# Altium footprint library PcbLib1.PcbLib: 56 footprints (part 1 of 4)
Each footprint in its own frame and in the unit in brackets; x right, y up, seen from the top. Pads: shape width x height; smd on the part's side, far side on the other; paste and mask are expansions set on the pad; w line width, h text height; cw(c..) or ccw(c..) is an arc to the next point about the centre after c.
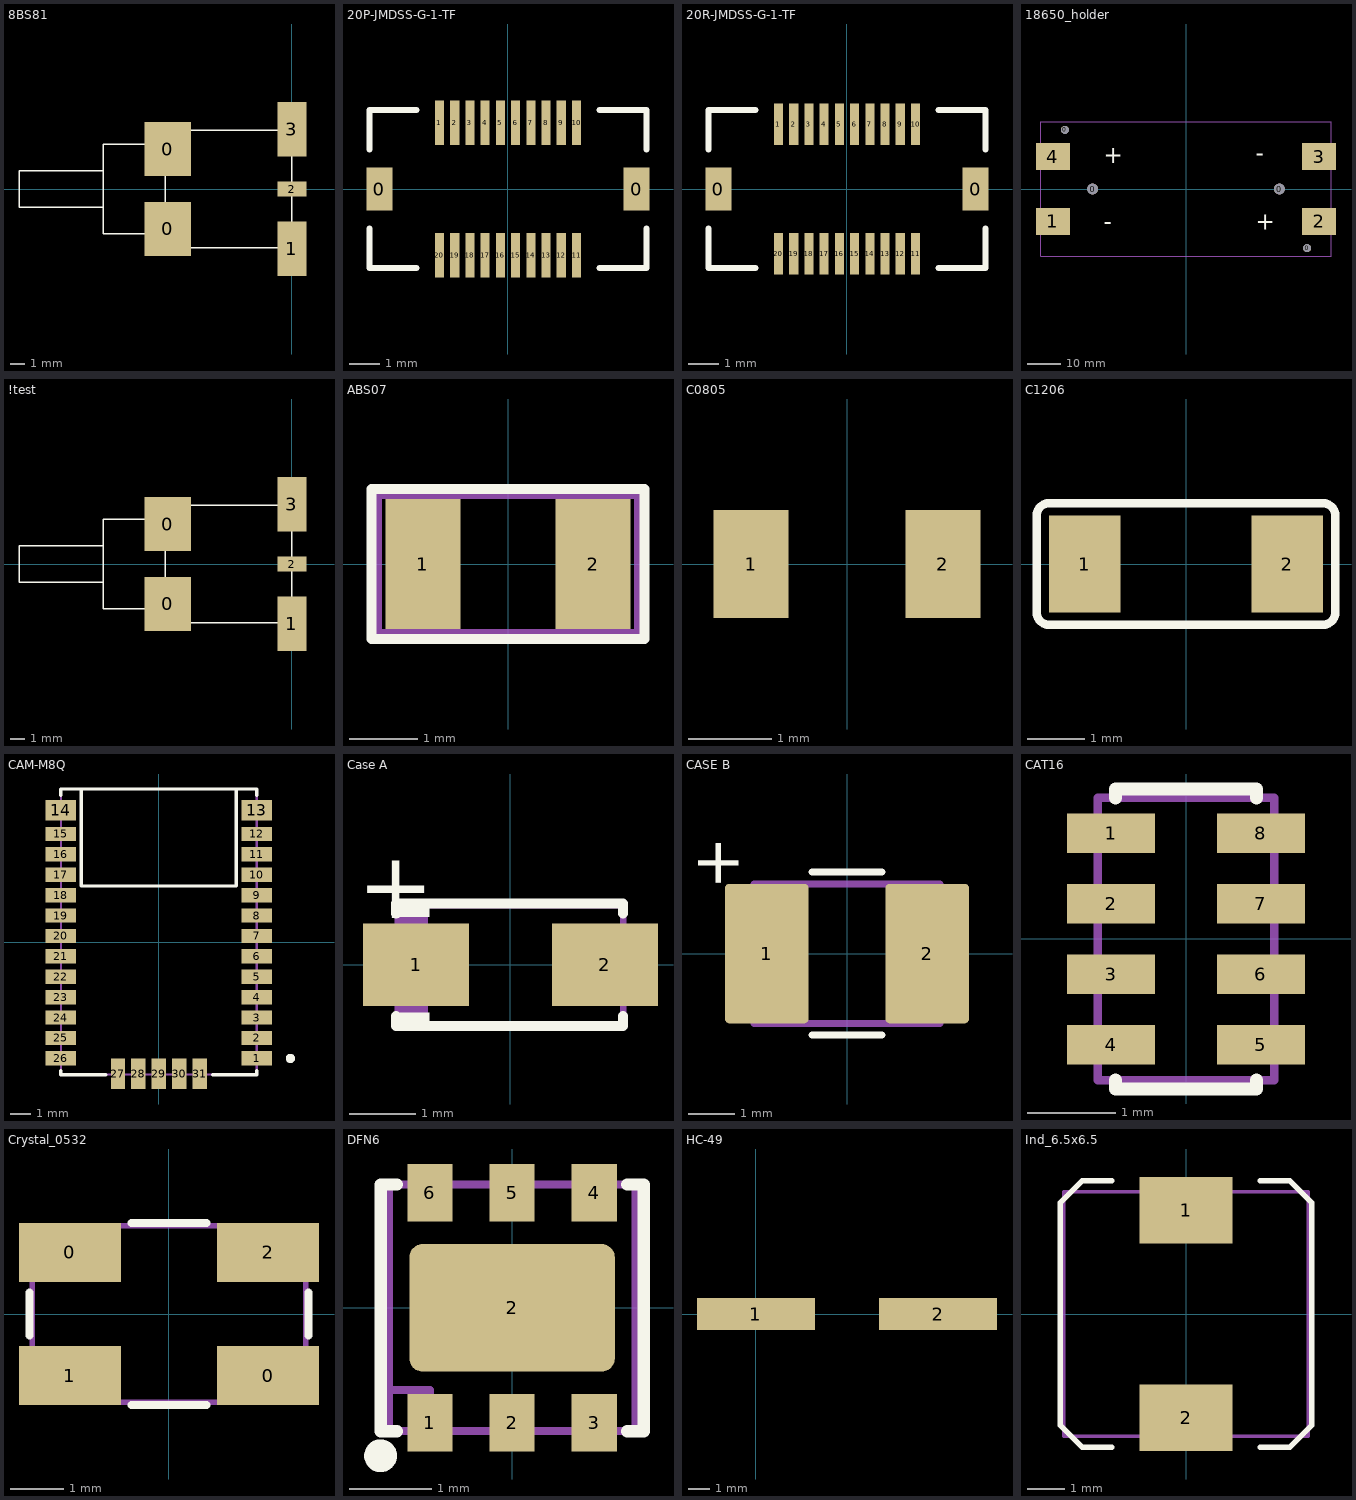
[diagram p0: the footprints below, top view; thin cyan lines are the x and y axes]

## 8BS81 [mm] "Button"
pads (5):
  rect 3.25x3.81 smd: 0(-8.7,-2.8) 0(-8.7,2.8)
  rect 2.03x3.81 smd: 1(0,-4.195) 3(0,4.195)
  rect 2.03x1.02 smd: 2(0,0)
Top Overlay:
  lines w0.1: -13.25,-1.27 -19.15,-1.27 -19.15,1.27 -13.25,1.27 ; -8.9,-3.15 -13.25,-3.15 -13.25,3.15 -8.9,3.15 ; -8.9,-4.115 0,-4.115 0,4.115 -8.9,4.115 -8.9,-4.115
3D body: height 6.2, standoff 0, extent -8.9,-4.125 0,4.125
3D body: height 6.2, standoff 0, extent -13.25,-3.15 -8.9,3.15
3D body: height 4.42, standoff 1.88, extent -19.15,-1.275 -13.25,1.275

## 20P-JMDSS-G-1-TF [mm] "20 pin plug"
pads (22):
  rect 0.85x1.4 smd: 0(-4.225,0) 0(4.225,0)
  rect 0.3x1.45 smd: 1(-2.25,2.175) 2(-1.75,2.175) 3(-1.25,2.175) 4(-0.75,2.175) 5(-0.25,2.175) 6(0.25,2.175) 7(0.75,2.175) 8(1.25,2.175) 9(1.75,2.175) 10(2.25,2.175) 11(2.25,-2.175) 12(1.75,-2.175) 13(1.25,-2.175) 14(0.75,-2.175) 15(0.25,-2.175) 16(-0.25,-2.175) 17(-0.75,-2.175) 18(-1.25,-2.175) 19(-1.75,-2.175) 20(-2.25,-2.175)
Top Overlay:
  lines w0.2: -4.55,-1.3 -4.55,-2.6 -3,-2.6 ; -4.55,1.3 -4.55,2.6 -3,2.6 ; 3,-2.6 4.55,-2.6 4.55,-1.3 ; 3,2.6 4.55,2.6 4.55,1.3

## 20R-JMDSS-G-1-TF [mm] "20 pin Receptacle"
pads (22):
  rect 0.85x1.4 smd: 0(-4.225,0) 0(4.225,0)
  rect 0.3x1.35 smd: 1(-2.25,2.125) 2(-1.75,2.125) 3(-1.25,2.125) 4(-0.75,2.125) 5(-0.25,2.125) 6(0.25,2.125) 7(0.75,2.125) 8(1.25,2.125) 9(1.75,2.125) 10(2.25,2.125) 11(2.25,-2.125) 12(1.75,-2.125) 13(1.25,-2.125) 14(0.75,-2.125) 15(0.25,-2.125) 16(-0.25,-2.125) 17(-0.75,-2.125) 18(-1.25,-2.125) 19(-1.75,-2.125) 20(-2.25,-2.125)
Top Overlay:
  lines w0.2: -4.55,-1.3 -4.55,-2.6 -3,-2.6 ; -4.55,1.3 -4.55,2.6 -3,2.6 ; 3,-2.6 4.55,-2.6 4.55,-1.3 ; 3,2.6 4.55,2.6 4.55,1.3

## 18650_holder [mm]
height 18
pads (8):
  round 2.4 hole 2.4 unplated: 0(-35.8,17.5) 0(35.8,-17.5)
  round 3.2 hole 3.2 unplated: 0(-27.6,0) 0(27.6,0)
  rect 10x8 smd: 1(-39.35,-9.55) 2(39.35,-9.55) 3(39.35,9.55) 4(-39.35,9.55)
Top Overlay:
  text "-" at 20.65,12.05 h5
  text "+" at -24.35,12.05 h5
  text "-" at -24.35,-12.05 h5
  text "+" at 20.65,-12.05 h5
Mechanical 15:
  lines w0.1: -42.95,-19.85 42.95,-19.85 42.95,19.85 -42.95,19.85 -42.95,-19.85
  text ".Designator" at -14.3,-1.7 h5
3D body "18650_holder.STEP": height 14.93, standoff -1.48, extent -43.002,-19.888 43.002,19.888

## !test [mm]
pads (5):
  rect 3.25x3.81 smd: 0(-8.7,-2.8) 0(-8.7,2.8)
  rect 2.03x3.81 smd: 1(0,-4.195) 3(0,4.195)
  rect 2.03x1.02 smd: 2(0,0)
Top Overlay:
  lines w0.1: -13.25,-1.27 -19.15,-1.27 -19.15,1.27 -13.25,1.27 ; -8.9,-3.15 -13.25,-3.15 -13.25,3.15 -8.9,3.15 ; -8.9,-4.115 0,-4.115 0,4.115 -8.9,4.115 -8.9,-4.115
3D body: height 6.2, standoff 0, extent -8.9,-4.125 0,4.125
3D body: height 6.2, standoff 0, extent -13.25,-3.15 -8.9,3.15
3D body: height 4.42, standoff 1.88, extent -19.15,-1.275 -13.25,1.275

## ABS07 [mm] "32.768"
pads (2):
  rect 1.1x1.9 smd: 1(-1.25,0) 2(1.25,0)
Top Overlay:
  lines w0.15: -2,-1.1 2,-1.1 2,1.1 -1.6,1.1 -2,1.1 -2,-1.1
Mechanical 15:
  lines w0.1: -1.9,-1 -1.9,1 1.9,1 1.9,-1 -1.9,-1
  text ".Designator" at -1.7,-0.1 h0.5
3D body "ABS07.STEP": height 0.91, standoff 0, extent -1.61,-0.76 1.61,0.76

## C0805 [mm] "Chip Capacitor, 2-Leads, Body 2,00x1,25mm, IPC Medium Density"
height 1.45
pads (2):
  rect 0.9x1.3 smd: 1(-1.15,0) 2(1.15,0)
3D body "Chip Capacitor 0805.step": height 1.32, standoff 0, extent -1,-0.635 1,0.635

## C1206 [mm] "Chip Capacitor, 2-Leads, Body 3,20x1,60mm, IPC Medium Density"
height 1.75
pads (2):
  rect 1.25x1.7 smd: 1(-1.775,0) 2(1.775,0)
Top Overlay:
  lines w0.15: -2.612,-0.85 ccw(c-2.4,-0.85) -2.4,-1.062 2.4,-1.062 ccw(c2.4,-0.85) 2.612,-0.85 2.612,0.85 ccw(c2.4,0.85) 2.4,1.062 -2.4,1.062 ccw(c-2.4,0.85) -2.612,0.85 -2.612,-0.85
3D body "Chip Capacitor 1206.step": height 1.52, standoff 0, extent -1.6,-0.81 1.6,0.81

## CAM-M8Q [mm]
pads (31):
  rect 1.5x0.7 smd: 1(4.8,-5.7) 2(4.8,-4.7) 3(4.8,-3.7) 4(4.8,-2.7) 5(4.8,-1.7) 6(4.8,-0.7) 7(4.8,0.3) 8(4.8,1.3) 9(4.8,2.3) 10(4.8,3.3) 11(4.8,4.3) 12(4.8,5.3) 15(-4.8,5.3) 16(-4.8,4.3) 17(-4.8,3.3) 18(-4.8,2.3) 19(-4.8,1.3) 20(-4.8,0.3) 21(-4.8,-0.7) 22(-4.8,-1.7) 23(-4.8,-2.7) 24(-4.8,-3.7) 25(-4.8,-4.7) 26(-4.8,-5.7)
  rect 1.5x1 smd: 13(4.8,6.45) 14(-4.8,6.45)
  rect 0.7x1.5 smd: 27(-2,-6.45) 28(-1,-6.45) 29(0,-6.45) 30(1,-6.45) 31(2,-6.45)
Top Overlay:
  circle w0.254: c6.45,-5.7 r0.1
  lines w0.16: -4.8,-6.3 -4.8,-6.5 -2.6,-6.5 ; -4.8,7.2 -4.8,7.5 4.8,7.5 4.8,7.2 ; -3.8,7.5 -3.8,2.75 3.8,2.75 3.8,7.5 ; 2.63,-6.5 4.45,-6.5 4.8,-6.5 4.8,-6.3
Mechanical 15:
  lines w0.1: -4.8,-6.5 -4.8,7.5 4.8,7.5 4.8,-6.5 -4.8,-6.5
  text ".Designator" at -1.9,-0.2 h0.5
Multi-Layer:
  pour cut-out: -3.8,7.5 -3.8,2.75 3.8,2.75 3.8,7.5
3D body "CAM.STEP": height 2.02, standoff 0.01, extent -4.81,-6.506 4.79,7.494

## Case A [mm]
height 1.6
pads (2):
  rect 1.6x1.25 smd: 1(-1.425,0) 2(1.425,0)
Top Overlay:
  region: -1.725,0.925 -1.225,0.925 -1.225,0.725 -1.725,0.725
  region: -1.725,-0.925 -1.225,-0.925 -1.225,-0.725 -1.725,-0.725
  lines w0.15: -1.725,-0.775 -1.725,-0.925 1.7,-0.925 1.7,-0.775 ; -1.725,0.775 -1.725,0.925 1.7,0.925 1.7,0.775
  text "+" at -2.3,0.7 h1
Mechanical 13:
  rectangle: -1.7,-0.9 -1.243,0.9
  lines w0.1: -1.7,-0.9 1.7,-0.9 1.7,0.9 -1.7,0.9 -1.7,-0.9
Mechanical 15:
  lines w0.1: -1.4,-0.9 -1.3,-0.9 -1.3,0.9 -1.7,0.9 ; -1.7,0.9 1.7,0.9 1.7,-0.9 -1.7,-0.9 -1.7,0.9
  text ".Designator" at -1.6,-0.1 h0.5
3D body "CAP_TANT_3216-18_A_case.step": height 1.8, standoff 0, extent -1.7,-0.9 1.7,0.9

## CASE B [mm]
pads (2):
  rrect10% 1.8x3 smd mask+0.07: 1(-1.725,0) 2(1.725,0)
Top Overlay:
  lines w0.15: -0.75,-1.75 0.75,-1.75 ; -0.75,1.75 0.75,1.75
  text "+" at -2.325,1.375 h1
Mechanical 15:
  lines w0.15: -1.3,-1.5 -1.3,1.5 ; -2,-1.5 2,-1.5 2,1.5 -2,1.5 -2,-1.5
  text ".Designator" at -1.1,-0.2 h0.5
3D body "User Library-AVX_BCASE.step": height 2.03, standoff 0, extent -1.85,-1.465 1.85,1.465

## CAT16 [mm] "Chip Array, Concave, 8-Leads, Pitch 0,80mm,  Body 3,20x1,55mm,  IPC Medium Density"
height 0.6
pads (8):
  rect 1x0.45 smd: 1(-0.85,1.2) 2(-0.85,0.4) 3(-0.85,-0.4) 4(-0.85,-1.2) 5(0.85,-1.2) 6(0.85,-0.4) 7(0.85,0.4) 8(0.85,1.2)
Top Overlay:
  lines w0.15: -0.8,-1.6 -0.8,-1.7 0.8,-1.7 0.8,-1.6 ; -0.8,1.6 -0.8,1.7 0.8,1.7 0.8,1.6
Mechanical 15:
  lines w0.1: -1,-1.6 1,-1.6 1,1.6 -1,1.6 -1,-1.6
  text ".Designator" at 0.2,-1.3 h0.5
3D body "cat16-470j4lf.stp": height 0.49, standoff -0.01, extent -0.775,-1.6 0.775,1.6

## Crystal_0532 [mm]
pads (4):
  rect 1.9x1.1 smd: 0(-1.85,1.15) 0(1.85,-1.15) 1(-1.85,-1.15) 2(1.85,1.15)
Top Overlay:
  lines w0.15: -2.6,-0.4 -2.6,0.4 ; -0.7,-1.7 0.7,-1.7 ; -0.7,1.7 0.7,1.7 ; 2.6,-0.4 2.6,0.4
Mechanical 15:
  lines w0.1: -2.55,-1.65 -2.55,1.65 -0.55,1.65 2.55,1.65 2.55,-1.65 -2.55,-1.65
  text ".Designator" at -1.55,-0.05 h0.5
3D body "CRYSTALSMD5X32.step": height 1, standoff 0, extent -2.5,-1.6 2.5,1.6

## DFN6 [mm]
pads (7):
  rect 0.55x0.7 smd: 1(-1,-1.4) 2(0,-1.4) 3(1,-1.4) 4(1,1.4) 5(0,1.4) 6(-1,1.4)
  rrect20% 2.5x1.55 smd: 2(0,0)
Top Overlay:
  circle w0.2: c-1.6,-1.8 r0.1
  lines w0.15: -1.4,-1.5 -1.6,-1.5 -1.6,1.5 -1.4,1.5 ; 1.4,-1.5 1.6,-1.5 1.6,1.5 1.4,1.5
Mechanical 15:
  lines w0.1: -1.5,-1 -1,-1 -1,-1.5 ; -1.5,-1.5 -1.5,1.5 1.5,1.5 1.5,-1.5 -1.5,-1.5
  text ".Designator" at -1.8,-0.1 h0.5
3D body "DFN6-3x3x0_80.step": height 0.85, standoff 0.05, extent -1.5,-1.5 1.5,1.5

## HC-49 [mm]
pads (2):
  rect 5.5x1.5 smd: 1(0,0) 2(8.5,0)
3D body "HC49_SMD.step": height 4.3, standoff 0, extent -1.9,-2.25 10.4,2.25

## Ind_6.5x6.5 [mm]
pads (2):
  rect 2.5x1.8 smd: 1(0,2.8) 2(0,-2.8)
Top Overlay:
  lines w0.15: -2,-3.6 -2.8,-3.6 -3.4,-3 -3.4,3 -2.8,3.6 -2,3.6 ; 2,-3.6 2.8,-3.6 3.4,-3 3.4,3 2.8,3.6 2,3.6
Mechanical 15:
  lines w0.1: -3.3,-3.3 -3.3,3.3 3.3,3.3 3.3,-3.3 -3.3,-3.3
  text ".Designator" at -1.8,-0.2 h0.5
3D body "srr0604-6r8ml.stp": height 4.8, standoff 0, extent -3.25,-3.25 3.25,3.25